# Altium footprint library d1_PcbLib.PcbLib: 266 footprints (part 8 of 17)
Each footprint in its own frame and in the unit in brackets; x right, y up, seen from the top. Pads: shape width x height; smd on the part's side, far side on the other; paste and mask are expansions set on the pad; w line width, h text height; cw(c..) or ccw(c..) is an arc to the next point about the centre after c.
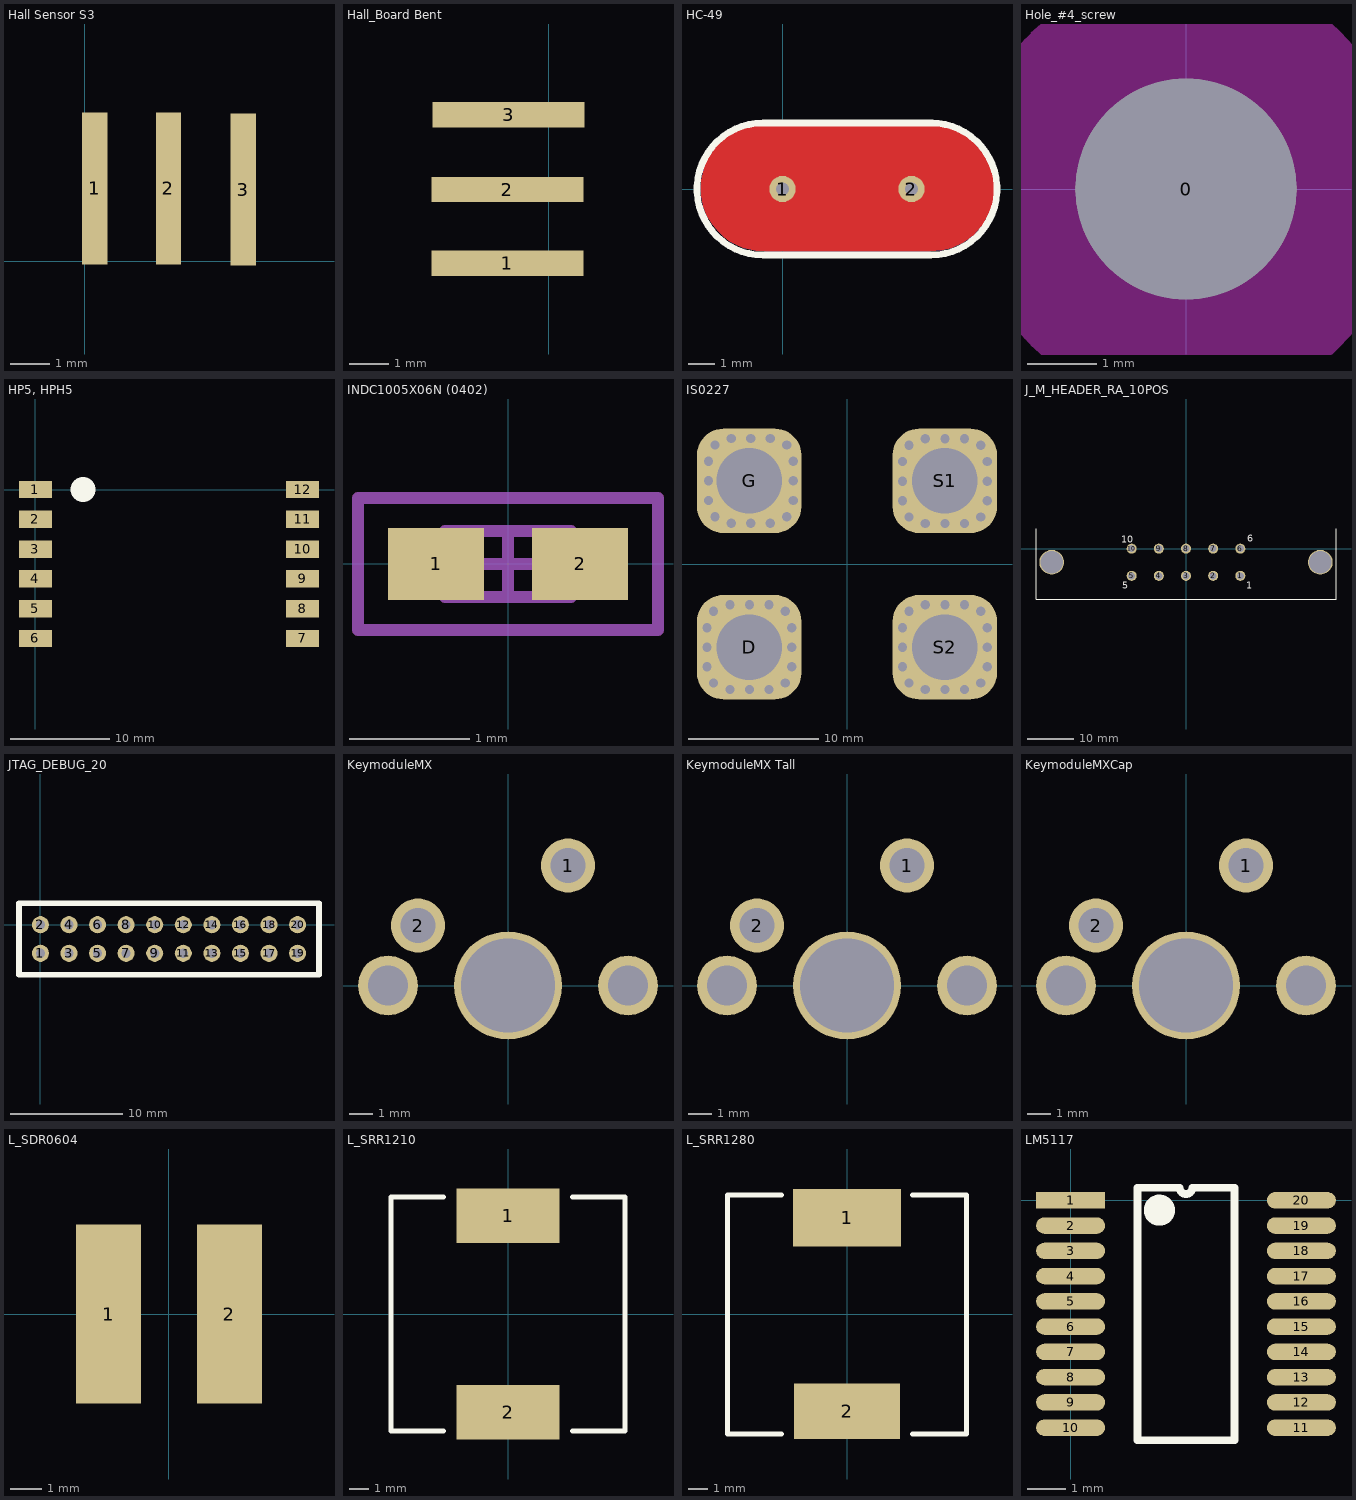
[diagram p7: the footprints below, top view; thin cyan lines are the x and y axes]

## Hall Sensor S3 [mil] "3 pin Hall sensor pad for mounting off PCB edge"
height 23
pads (3):
  rect 25x150 smd: 1(10,72) 2(83,72) 3(157,71)
3D body: height 29.13, standoff -18.11, extent -17,-1 187.72,713.96

## Hall_Board Bent [mil] "Uber Motor Halls with bent tips"
pads (3):
  rect 150x25 smd: 1(-41,712) 2(-41,785) 3(-40,859)
3D body: height 13.82, standoff -199.96, extent -472.12,683 33,887.72

## HC-49 [mm]
pads (2):
  round 1 hole 0.5: 1(0,0) 2(4.88,0)
Top Layer:
  pour cut-out: -2.591,1.499 -2.388,1.727 -2.235,1.854 -1.981,2.057 -1.727,2.184 -1.448,2.311 -1.067,2.388 -0.787,2.413 5.766,2.413 6.172,2.337 6.579,2.21 6.909,2.032 7.239,1.778 7.595,1.372 7.849,0.914 7.976,0.533 8.026,0.127 8.026,-0.178 7.95,-0.559 7.772,-0.991 7.569,-1.346 7.188,-1.778 6.858,-2.007 6.375,-2.235 6.02,-2.311 5.588,-2.362 -0.686,-2.362 -1.016,-2.337 -1.27,-2.286 -1.502,-2.216 -1.753,-2.108 -2.007,-1.981 -2.21,-1.829 -2.438,-1.6 -2.642,-1.346 -2.87,-1.016 -2.997,-0.66 -3.073,-0.279 -3.099,0.025 -3.073,0.33 -3.023,0.584 -2.946,0.889 -2.819,1.118 -2.718,1.295
Bottom Layer:
  pour cut-out: 7.518,1.499 7.315,1.727 7.163,1.854 6.909,2.057 6.655,2.184 6.375,2.311 5.994,2.388 5.715,2.413 -0.838,2.413 -1.245,2.337 -1.651,2.21 -1.981,2.032 -2.311,1.778 -2.667,1.372 -2.921,0.914 -3.048,0.533 -3.099,0.127 -3.099,-0.178 -3.023,-0.559 -2.845,-0.991 -2.642,-1.346 -2.261,-1.778 -1.93,-2.007 -1.448,-2.235 -1.092,-2.311 -0.66,-2.362 5.613,-2.362 5.944,-2.337 6.198,-2.286 6.43,-2.216 6.68,-2.108 6.934,-1.981 7.137,-1.829 7.366,-1.6 7.569,-1.346 7.798,-1.016 7.925,-0.66 8.001,-0.279 8.026,0.025 8.001,0.33 7.95,0.584 7.874,0.889 7.747,1.118 7.645,1.295
Top Overlay:
  lines w0.254: -0.737,2.5 5.664,2.5 ; -0.735,-2.5 cw(c-0.735,0) -0.735,2.5 ; -0.711,-2.5 5.613,-2.5 ; 5.615,-2.5 ccw(c5.615,0) 5.615,2.5
3D body: height 3.3, standoff -0.76, extent -3.251,-1.778 8.099,1.872

## Hole_#4_screw [mm]
pads (1):
  round 3.175 hole 3.175 unplated: 0(0,0)
Keep-Out Layer:
  circle w2.032: c0,0 r2.159

## HP5, HPH5 [mm]
pads (12):
  rect 3.3x1.75 smd: 1(0,0) 2(0,-3) 3(0,-6) 4(0,-9) 5(0,-12) 6(0,-15) 7(26.92,-15) 8(26.92,-12) 9(26.92,-9) 10(26.92,-6) 11(26.92,-3) 12(26.92,0)
Top Overlay:
  lines w2.5: 4.801,0 4.826,0
3D body: height 10.5, standoff 0, extent -1.325,-17.785 27.825,2.785

## INDC1005X06N (0402) [mm] "Chip Inductor, 2-Leads, Body 1.0x0.5mm, IPC Medium Density"
height 0.55
pads (2):
  rect 0.8x0.6 smd: 1(-0.6,0) 2(0.6,0)
Mechanical 13:
  lines w0.1: -0.525,-0.275 0.525,-0.275 0.525,0.275 -0.525,0.275 -0.525,-0.275
Mechanical 15:
  lines w0.1: -0.275,0 0.275,0 ; 0,-0.275 0,0.275 ; -1.25,-0.55 1.25,-0.55 1.25,0.55 -1.25,0.55 -1.25,-0.55
3D body: height 0.55, standoff 0, extent -0.525,-0.275 0.525,0.275

## IS0227 [mm]
pads (4):
  rrect50% 8x8 hole 5: D(-7.5,-6.375) G(-7.5,6.375) S1(7.5,6.375) S2(7.5,-6.375)
via -4.626,3.625 diameter 1.27 hole 0.711
via -7.376,3.125 diameter 1.27 hole 0.711
via -7.376,9.625 diameter 1.27 hole 0.711
via -4.126,6.375 diameter 1.27 hole 0.711
via -10.626,6.375 diameter 1.27 hole 0.711
via -4.626,9.125 diameter 1.27 hole 0.711
via -10.126,9.125 diameter 1.27 hole 0.711
via -10.126,3.625 diameter 1.27 hole 0.711
via -4.126,4.875 diameter 1.27 hole 0.711
via -5.876,3.125 diameter 1.27 hole 0.711
via -8.876,3.125 diameter 1.27 hole 0.711
via -10.626,4.875 diameter 1.27 hole 0.711
via -10.626,7.875 diameter 1.27 hole 0.711
via -8.876,9.625 diameter 1.27 hole 0.711
via -5.876,9.625 diameter 1.27 hole 0.711
via -4.126,7.875 diameter 1.27 hole 0.711
via 10.758,-4.877 diameter 1.27 hole 0.711
via 9.008,-3.127 diameter 1.27 hole 0.711
via 6.008,-3.127 diameter 1.27 hole 0.711
via 4.258,-4.877 diameter 1.27 hole 0.711
via 4.258,-7.877 diameter 1.27 hole 0.711
via 6.008,-9.627 diameter 1.27 hole 0.711
via 9.008,-9.627 diameter 1.27 hole 0.711
via 10.758,-7.877 diameter 1.27 hole 0.711
via 10.258,-9.127 diameter 1.27 hole 0.711
via 4.758,-9.127 diameter 1.27 hole 0.711
via 4.758,-3.627 diameter 1.27 hole 0.711
via 10.258,-3.627 diameter 1.27 hole 0.711
via 4.258,-6.377 diameter 1.27 hole 0.711
via 10.758,-6.377 diameter 1.27 hole 0.711
via 7.508,-3.127 diameter 1.27 hole 0.711
via 7.508,-9.627 diameter 1.27 hole 0.711
via -4.228,-4.877 diameter 1.27 hole 0.711
via -5.978,-3.127 diameter 1.27 hole 0.711
via -8.978,-3.127 diameter 1.27 hole 0.711
via -10.728,-4.877 diameter 1.27 hole 0.711
via -10.728,-7.877 diameter 1.27 hole 0.711
via -8.978,-9.627 diameter 1.27 hole 0.711
via -5.978,-9.627 diameter 1.27 hole 0.711
via -4.228,-7.877 diameter 1.27 hole 0.711
via -4.728,-9.127 diameter 1.27 hole 0.711
via -10.228,-9.127 diameter 1.27 hole 0.711
via -10.228,-3.627 diameter 1.27 hole 0.711
via -4.728,-3.627 diameter 1.27 hole 0.711
via -10.728,-6.377 diameter 1.27 hole 0.711
via -4.228,-6.377 diameter 1.27 hole 0.711
via -7.478,-3.127 diameter 1.27 hole 0.711
via -7.478,-9.627 diameter 1.27 hole 0.711
via 10.758,7.85 diameter 1.27 hole 0.711
via 9.008,9.6 diameter 1.27 hole 0.711
via 6.008,9.6 diameter 1.27 hole 0.711
via 4.258,7.85 diameter 1.27 hole 0.711
via 4.258,4.85 diameter 1.27 hole 0.711
via 6.008,3.1 diameter 1.27 hole 0.711
via 9.008,3.1 diameter 1.27 hole 0.711
via 10.758,4.85 diameter 1.27 hole 0.711
via 10.258,3.6 diameter 1.27 hole 0.711
via 4.758,3.6 diameter 1.27 hole 0.711
via 4.758,9.1 diameter 1.27 hole 0.711
via 10.258,9.1 diameter 1.27 hole 0.711
via 4.258,6.35 diameter 1.27 hole 0.711
via 10.758,6.35 diameter 1.27 hole 0.711
via 7.508,9.6 diameter 1.27 hole 0.711
via 7.508,3.1 diameter 1.27 hole 0.711
3D body: height -0.51, standoff -12.7, extent -19.05,-12.7 19.05,12.7

## J_M_HEADER_RA_10POS [mil]
pads (12):
  round 85 hole 60: 1(460,-230) 2(230,-230) 3(0,-230) 4(-230,-230) 5(-460,-230) 6(460,0) 7(230,0) 8(0,0) 9(-230,0) 10(-460,0)
  round 210 hole 190: ""(-1137,-115) ""(1137,-115)
Top Overlay:
  lines w10: -1270,170 -1270,-430 1270,-430 1270,170
  text "1" at 510,-340 h60
  text "5" at -540,-340 h60
  text "6" at 520,60 h60
  text "10" at -550,50 h60
3D body: height 1272.49, standoff -124.5, extent -1269.86,-430 1269.86,1131

## JTAG_DEBUG_20 [mil]
pads (20):
  round 60 hole 32: 1(0,-100) 2(0,0) 3(100,-100) 4(100,0) 5(200,-100) 6(200,0) 7(300,-100) 8(300,0) 9(400,-100) 10(400,0) 11(500,-100) 12(500,0) 13(600,-100) 14(600,0) 15(700,-100) 16(700,0) 17(800,-100) 18(800,0) 19(900,-100) 20(900,0)
Top Overlay:
  lines w20: -75,-175 975,-175 975,75 -75,75 -75,-175

## KeymoduleMX [mil]
pads (5):
  round 90 hole 59.06: 1(100,200) 2(-150,100)
  round 100 hole 66.93: ""(-200,0) ""(200,0)
  round 180 hole 157.48: ""(0,0)
3D body: height 598.43, standoff 0, extent -307.09,-300 307.09,314.17
3D body: height 0, standoff 0, extent 0,0 0,0

## KeymoduleMX Tall [mil]
pads (5):
  round 90 hole 59: 1(100,200) 2(-150,100)
  round 100 hole 67: ""(-200,0) ""(200,0)
  round 180 hole 157: ""(0,0)
3D body: height 0, standoff 0, extent 0,0 0,0
3D body: height 614.17, standoff 0, extent -304.17,-289.21 310,309.21

## KeymoduleMXCap [mil]
pads (5):
  round 90 hole 59: 1(100,200) 2(-150,100)
  round 100 hole 67: ""(-200,0) ""(200,0)
  round 180 hole 157: ""(0,0)
3D body: height 393.7, standoff 0, extent -393.7,-393.7 393.7,393.7
3D body: height 0, standoff 0, extent 0,0 0,0

## L_SDR0604 [mm]
pads (2):
  rect 2.1x5.8 smd: 1(-1.95,0) 2(1.95,0)

## L_SRR1210 [mm]
pads (2):
  rect 5.3x2.8 smd: 1(0,5.05) 2(0,-5.05)
Top Overlay:
  lines w0.254: -3.3,-6 -6,-6 -6,6 -3.3,6 ; 3.3,-6 6,-6 6,6 3.3,6
3D body: height 10.01, standoff 0, extent -5.944,-6.68 6.045,6.655

## L_SRR1280 [mm]
pads (2):
  rect 5.4x2.9 smd: 1(0,4.85)
  rect 5.3x2.8 smd: 2(0,-4.85)
Top Overlay:
  lines w0.254: -3.3,-6 -6,-6 -6,6 -3.3,6 ; 3.3,-6 6,-6 6,6 3.3,6
3D body: height 10.01, standoff 0, extent -5.944,-6.68 6.045,6.655

## LM5117 [mm]
pads (20):
  rect 1.78x0.42 smd: 1(0,0)
  oval 1.78x0.42 smd: 2(0,-0.65) 3(0,-1.3) 4(0,-1.95) 5(0,-2.6) 6(0,-3.25) 7(0,-3.9) 8(0,-4.55) 9(0,-5.2) 10(0,-5.85) 11(5.94,-5.85) 12(5.94,-5.2) 13(5.94,-4.55) 14(5.94,-3.9) 15(5.94,-3.25) 16(5.94,-2.6) 17(5.94,-1.95) 18(5.94,-1.3) 19(5.94,-0.65) 20(5.94,0)
Top Overlay:
  circle w0.4: c2.286,-0.254 r0.2
  lines w0.2: 1.725,-6.175 1.725,0.325 2.808,0.325 ccw(c2.97,0.325) 3.132,0.325 4.215,0.325 4.215,-6.175 1.725,-6.175